# Altium footprint library std-smt.PcbLib: 117 footprints (part 1 of 8)
Each footprint in its own frame and in the unit in brackets; x right, y up, seen from the top. Pads: shape width x height; smd on the part's side, far side on the other; paste and mask are expansions set on the pad; w line width, h text height; cw(c..) or ccw(c..) is an arc to the next point about the centre after c.
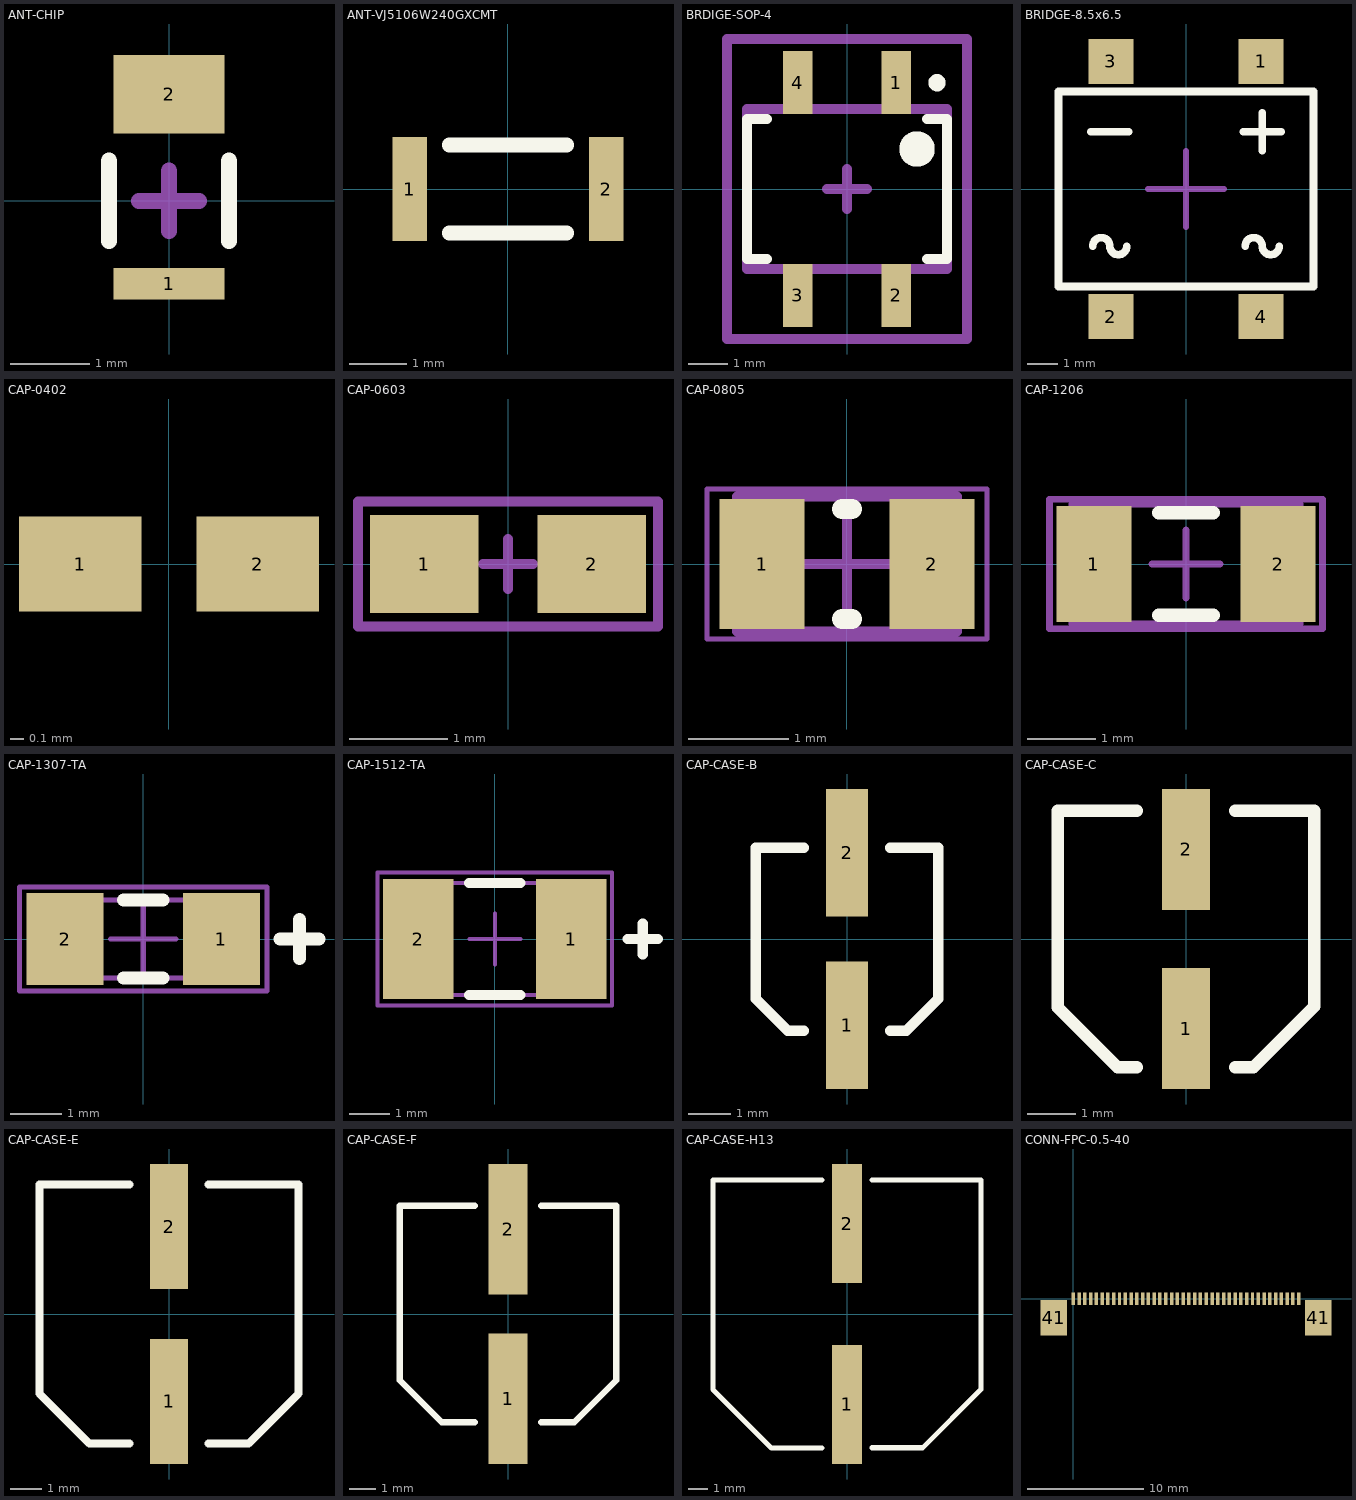
[diagram p0: the footprints below, top view; thin cyan lines are the x and y axes]

## ANT-CHIP [mm] "Antenna, 2012, 2 leads"
height 1
pads (2):
  rect 1.4x0.4 smd: 1(0,-1.05)
  rect 1.4x1 smd: 2(0,1.35)
Top Overlay:
  lines w0.203: -0.762,-0.508 -0.762,0.508 ; 0.762,-0.508 0.762,0.508
Mechanical 15:
  lines w0.203: -0.381,0 0.381,0 ; 0,-0.381 0,0.381
3D body: height 0.6, standoff 0, extent -0.625,-1 0.625,1

## ANT-VJ5106W240GXCMT [mm] "Chip antenna, Vishay, VJ5106W240GXCMT"
height 0.4
pads (2):
  rect 0.6x1.8 smd: 1(-1.7,0) 2(1.7,0)
Top Overlay:
  lines w0.254: -1.016,-0.762 1.016,-0.762 ; -1.016,0.762 1.016,0.762
3D body: height 0.7, standoff 0, extent -1.7,-0.85 1.7,0.85

## BRDIGE-SOP-4 [mm] "SOP-4 package, also used for Bourns SOD-106 rectifiers"
height 3
pads (4):
  rect 0.75x1.6 smd: 1(1.25,2.7) 2(1.25,-2.7) 3(-1.25,-2.7) 4(-1.25,2.7)
Top Overlay:
  circle w0.5: c1.778,1.016 r0.2
  circle w0.254: c2.286,2.7 r0.094
  lines w0.254: -2.032,-1.778 -2.54,-1.778 -2.54,1.778 -2.032,1.778 ; 2.032,-1.778 2.54,-1.778 2.54,1.778 2.032,1.778
Mechanical 13:
  lines w0.254: -2.54,-2.032 2.54,-2.032 2.54,2.032 -2.54,2.032 -2.54,-2.032
Mechanical 15:
  lines w0.254: -0.508,0 0.508,0 ; 0,-0.508 0,0.508 ; -3.048,-3.81 -3.048,3.81 3.048,3.81 3.048,-3.81 -3.048,-3.81
3D body: height 2.9, standoff 0, extent -2.475,-3.343 2.475,3.343

## BRIDGE-8.5x6.5 [mm] "Bridge rectifier, SMD; body 8.5 x 6.5 mm; leads 5 mm pitch"
height 3.3
pads (4):
  rect 1.5x1.5 smd: 1(2.5,4.25) 2(-2.5,-4.25) 3(-2.5,4.25) 4(2.5,-4.25)
Top Overlay:
  lines w0.254: -3.175,1.905 -1.905,1.905 ; -3.108,-1.905 cw(c-2.824,-1.905) -2.54,-1.905 ccw(c-2.256,-1.905) -1.972,-1.905 ; 1.905,1.905 3.175,1.905 ; 1.972,-1.905 cw(c2.256,-1.905) 2.54,-1.905 ccw(c2.824,-1.905) 3.108,-1.905 ; 2.54,1.27 2.54,2.54 ; -4.25,-3.25 4.25,-3.25 4.25,3.25 -4.25,3.25 -4.25,-3.25
Mechanical 15:
  lines w0.203: -1.27,0 1.27,0 ; 0,-1.27 0,1.27
3D body: height 3.63, standoff 0, extent -4.258,-5.004 4.242,4.996

## CAP-0402 [mm] "Capacitor, SMD, 0402"
height 0.508
pads (2):
  rect 0.9x0.7 smd: 1(-0.65,0) 2(0.65,0)
3D body: height 0.55, standoff 0, extent -0.5,-0.25 0.5,0.25

## CAP-0603 [mm] "SMD capacitor, 0603"
height 1.397
pads (2):
  rect 1.1x1 smd: 1(-0.85,0) 2(0.85,0)
Mechanical 15:
  lines w0.1: -0.254,0 0.254,0 ; 0,-0.254 0,0.254 ; -1.524,-0.635 -1.524,0.635 1.524,0.635 1.524,-0.635 -1.524,-0.635
3D body: height 0.86, standoff 0, extent -0.8,-0.4 0.8,0.4

## CAP-0805 [mm] "Chip Capacitor, Body 2.0x1.3mm, IPC High Density"
height 0.7
pads (2):
  rect 0.85x1.3 smd: 1(-0.85,0) 2(0.85,0)
Top Overlay:
  lines w0.2: -0.05,-0.55 0.05,-0.55 ; -0.05,0.55 0.05,0.55
Mechanical 13:
  lines w0.1: -1.1,-0.675 1.1,-0.675 1.1,0.675 -1.1,0.675 -1.1,-0.675
Mechanical 15:
  lines w0.05: -1.4,-0.75 1.4,-0.75 1.4,0.75 -1.4,0.75 -1.4,-0.75
  lines w0.1: -0.5,0 0.5,0 ; 0,-0.5 0,0.5
3D body: height 0.78, standoff 0, extent -1,-0.625 1,0.625

## CAP-1206 [mm] "SMD capacitor, 1206"
height 0.635
pads (2):
  rect 1.1x1.7 smd: 1(-1.35,0) 2(1.35,0)
Top Overlay:
  lines w0.2: -0.4,-0.75 0.4,-0.75 ; -0.4,0.75 0.4,0.75
Mechanical 13:
  lines w0.1: -1.675,-0.875 -1.675,0.875 1.675,0.875 1.675,-0.875 -1.675,-0.875
Mechanical 15:
  lines w0.1: -0.5,0 0.5,0 ; 0,-0.5 0,0.5 ; -2,-0.95 -2,0.95 2,0.95 2,-0.95 -2,-0.95
3D body: height 1, standoff 0, extent -1.6,-0.8 1.6,0.8

## CAP-1307-TA [mm] "SMD Capacitor, 1307, Tantalum"
height 2
pads (2):
  rect 1.5x1.8 smd: 1(1.524,0) 2(-1.524,0)
Top Overlay:
  lines w0.254: -0.381,-0.762 0.381,-0.762 ; -0.381,0.762 0.381,0.762 ; 2.667,0 3.429,0 ; 3.048,-0.381 3.048,0.381
Mechanical 13:
  lines w0.1: -1.651,-0.762 1.651,-0.762 1.651,0.762 -1.651,0.762 -1.651,-0.762
Mechanical 15:
  lines w0.1: -0.635,0 0.635,0 ; 0,-0.635 0,0.635 ; -2.413,-1.016 2.413,-1.016 2.413,1.016 -2.413,1.016 -2.413,-1.016
3D body: height 1.77, standoff 0.17, extent -1.587,-0.814 1.587,0.786

## CAP-1512-TA [mm] "SMD Capacitor, 1512, Tantalum"
height 2
pads (2):
  rect 1.75x3 smd: 1(1.905,0) 2(-1.905,0)
Top Overlay:
  lines w0.254: -0.635,-1.397 0.635,-1.397 ; -0.635,1.397 0.635,1.397 ; 3.302,0 4.064,0 ; 3.683,-0.381 3.683,0.381
Mechanical 13:
  lines w0.1: -1.778,-1.397 1.778,-1.397 1.778,1.397 -1.778,1.397 -1.778,-1.397
Mechanical 15:
  lines w0.1: -0.635,0 0.635,0 ; 0,-0.635 0,0.635 ; -2.921,-1.651 2.921,-1.651 2.921,1.651 -2.921,1.651 -2.921,-1.651
3D body: height 1.91, standoff 0, extent -1.746,-1.4 1.746,1.4

## CAP-CASE-B [mm] "Capacitor, Case Style B"
height 5
pads (2):
  rect 1x3 smd: 1(0,-2.032) 2(0,2.032)
Top Overlay:
  lines w0.254: -1.016,-2.159 -1.397,-2.159 -2.15,-1.406 -2.15,-1.152 -2.15,2.15 -1.016,2.15 ; 1.016,-2.159 1.397,-2.159 2.15,-1.406 2.15,-1.152 2.15,2.15 1.016,2.15
3D body: height 5.4, standoff 0, extent -2.15,-2.3 2.15,2.3

## CAP-CASE-C [mm] "Capacitor, Case Style C"
height 7
pads (2):
  rect 1x2.5 smd: 1(0,-1.85) 2(0,1.85)
Top Overlay:
  lines w0.254: -1.016,-2.65 -1.414,-2.65 -2.65,-1.414 -2.65,2.65 -1.016,2.65 ; 1.016,-2.65 1.397,-2.65 2.65,-1.397 2.65,2.65 1.016,2.65
3D body: height 5.41, standoff 0, extent -2.65,-2.95 2.65,2.95

## CAP-CASE-E [mm] "Capacitor, Case Style E"
height 8
pads (2):
  rect 1.2x4 smd: 1(0,-2.8) 2(0,2.8)
Top Overlay:
  lines w0.254: -1.27,-4.15 -2.54,-4.15 -4.15,-2.54 -4.15,4.15 -1.27,4.15 ; 1.27,-4.15 2.54,-4.15 4.15,-2.54 4.15,4.15 1.27,4.15
3D body: height 6.2, standoff 0, extent -4.15,-4.5 4.15,4.5

## CAP-CASE-F [mm] "Capacitor, Case Style F"
height 12
pads (2):
  rect 1.5x5 smd: 1(0,-3.25) 2(0,3.25)
Top Overlay:
  lines w0.254: -1.27,-4.15 -2.54,-4.15 -4.15,-2.54 -4.15,4.15 -1.27,4.15 ; 1.27,-4.15 2.54,-4.15 4.15,-2.54 4.15,4.15 1.27,4.15
3D body: height 10.2, standoff 0, extent -4.15,-4.95 4.15,4.95

## CAP-CASE-H13 [mm] "Capacitor, Case Style H13"
height 18
pads (2):
  rect 1.5x6 smd: 1(0,-4.55) 2(0,4.55)
Top Overlay:
  lines w0.254: -1.27,-6.75 -3.81,-6.75 -6.75,-3.81 -6.75,6.75 -1.27,6.75 ; 1.27,-6.731 3.81,-6.731 6.75,-3.791 6.75,6.75 1.27,6.75
3D body: height 13.5, standoff -0.01, extent -6.75,-6.9 6.75,6.9

## CONN-FPC-0.5-40 [mm] "FPC flat cable connector, 0.5 mm pitch, 40 way"
height 2
pads (42):
  rect 0.3x1.1 smd: 1(19.5,0) 2(19,0) 3(18.5,0) 4(18,0) 5(17.5,0) 6(17,0) 7(16.5,0) 8(16,0) 9(15.5,0) 10(15,0) 11(14.5,0) 12(14,0) 13(13.5,0) 14(13,0) 15(12.5,0) 16(12,0) 17(11.5,0) 18(11,0) 19(10.5,0) 20(10,0) 21(9.5,0) 22(9,0) 23(8.5,0) 24(8,0) 25(7.5,0) 26(7,0) 27(6.5,0) 28(6,0) 29(5.5,0) 30(5,0) 31(4.5,0) 32(4,0) 33(3.5,0) 34(3,0) 35(2.5,0) 36(2,0) 37(1.5,0) 38(1,0) 39(0.5,0) 40(0,0)
  rect 2.3x3.1 smd: 41(-1.67,-1.65) 41(21.17,-1.65)
3D body: height 2, standoff -0.05, extent -3,-6.725 22.5,0.425